# Altium footprint library PCB_Footprints.PcbLib: 303 footprints (part 6 of 19)
Each footprint in its own frame and in the unit in brackets; x right, y up, seen from the top. Pads: shape width x height; smd on the part's side, far side on the other; paste and mask are expansions set on the pad; w line width, h text height; cw(c..) or ccw(c..) is an arc to the next point about the centre after c.
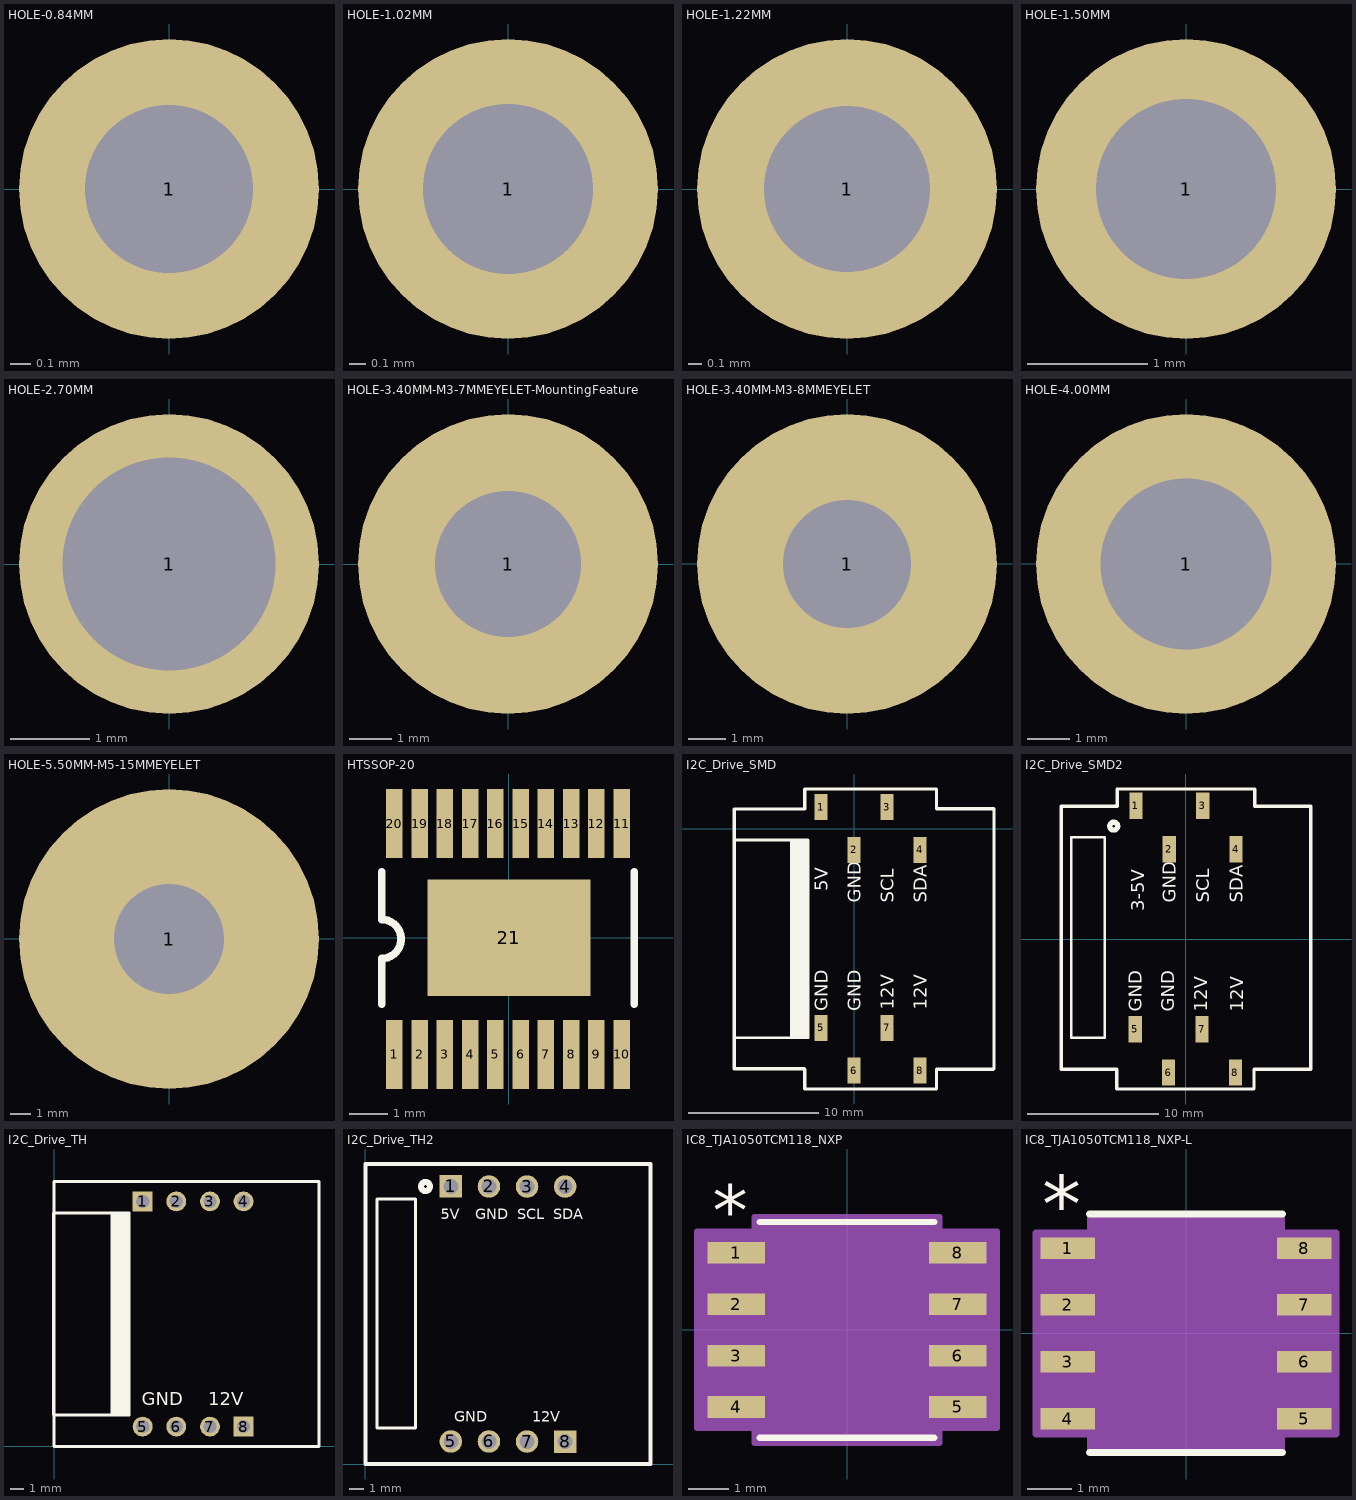
[diagram p5: the footprints below, top view; thin cyan lines are the x and y axes]

## HOLE-0.84MM [mm] "Hole 0.84mm"
pads (1):
  round 1.5 hole 0.84: 1(0,0)

## HOLE-1.02MM [mm] "Hole 1.02mm"
pads (1):
  round 1.8 hole 1.02: 1(0,0)

## HOLE-1.22MM [mm] "Hole 1.22mm"
pads (1):
  round 2.2 hole 1.22: 1(0,0)

## HOLE-1.50MM [mm] "Hole 1.50mm"
pads (1):
  round 2.5 hole 1.5: 1(0,0)

## HOLE-2.70MM [mm] "Hole 2.70mm"
pads (1):
  round 3.8 hole 2.7: 1(0,0)

## HOLE-3.40MM-M3-7MMEYELET-MountingFeature [mm] "Hole 3.40mm with round pad for eyelet"
pads (1):
  round 7 / inner round 4 / far side round 7 hole 3.4 mask+0.2: 1(0,0)
Top Paste:
  region: -0.851,-3.395 -0.641,-3.448 -0.212,-3.5 0.221,-3.5 0.65,-3.446 0.86,-3.393 0.232,-2.196 -0.222,-2.196
  region: 1.799,-3.002 1.985,-2.891 2.325,-2.625 2.631,-2.319 2.896,-1.977 3.007,-1.791 1.717,-1.389 1.396,-1.71
  region: 3.395,-0.851 3.448,-0.641 3.5,-0.212 3.5,0.221 3.446,0.65 3.393,0.86 2.196,0.232 2.196,-0.222
  region: 3.002,1.799 2.891,1.985 2.625,2.325 2.319,2.631 1.977,2.896 1.791,3.007 1.389,1.717 1.71,1.396
  region: 0.851,3.395 0.641,3.448 0.212,3.5 -0.221,3.5 -0.65,3.446 -0.86,3.393 -0.232,2.196 0.222,2.196
  region: -1.799,3.002 -1.985,2.891 -2.325,2.625 -2.631,2.319 -2.896,1.977 -3.007,1.791 -1.717,1.389 -1.396,1.71
  region: -3.395,0.851 -3.448,0.641 -3.5,0.212 -3.5,-0.221 -3.446,-0.65 -3.393,-0.86 -2.196,-0.232 -2.196,0.222
  region: -3.002,-1.799 -2.891,-1.985 -2.625,-2.325 -2.319,-2.631 -1.977,-2.896 -1.791,-3.007 -1.389,-1.717 -1.71,-1.396
Bottom Paste:
  region: -0.851,-3.395 -0.641,-3.448 -0.212,-3.5 0.221,-3.5 0.65,-3.446 0.86,-3.393 0.232,-2.196 -0.222,-2.196
  region: 1.799,-3.002 1.985,-2.891 2.325,-2.625 2.631,-2.319 2.896,-1.977 3.007,-1.791 1.717,-1.389 1.396,-1.71
  region: 3.395,-0.851 3.448,-0.641 3.5,-0.212 3.5,0.221 3.446,0.65 3.393,0.86 2.196,0.232 2.196,-0.222
  region: 3.002,1.799 2.891,1.985 2.625,2.325 2.319,2.631 1.977,2.896 1.791,3.007 1.389,1.717 1.71,1.396
  region: 0.851,3.395 0.641,3.448 0.212,3.5 -0.221,3.5 -0.65,3.446 -0.86,3.393 -0.232,2.196 0.222,2.196
  region: -1.799,3.002 -1.985,2.891 -2.325,2.625 -2.631,2.319 -2.896,1.977 -3.007,1.791 -1.717,1.389 -1.396,1.71
  region: -3.395,0.851 -3.448,0.641 -3.5,0.212 -3.5,-0.221 -3.446,-0.65 -3.393,-0.86 -2.196,-0.232 -2.196,0.222
  region: -3.002,-1.799 -2.891,-1.985 -2.625,-2.325 -2.319,-2.631 -1.977,-2.896 -1.791,-3.007 -1.389,-1.717 -1.71,-1.396
Top Solder:
  region: -0.851,-3.395 -0.641,-3.448 -0.212,-3.5 0.221,-3.5 0.65,-3.446 0.86,-3.393 0.232,-2.196 -0.222,-2.196
  region: 1.799,-3.002 1.985,-2.891 2.325,-2.625 2.631,-2.319 2.896,-1.977 3.007,-1.791 1.717,-1.389 1.396,-1.71
  region: 3.395,-0.851 3.448,-0.641 3.5,-0.212 3.5,0.221 3.446,0.65 3.393,0.86 2.196,0.232 2.196,-0.222
  region: 3.002,1.799 2.891,1.985 2.625,2.325 2.319,2.631 1.977,2.896 1.791,3.007 1.389,1.717 1.71,1.396
  region: 0.851,3.395 0.641,3.448 0.212,3.5 -0.221,3.5 -0.65,3.446 -0.86,3.393 -0.232,2.196 0.222,2.196
  region: -1.799,3.002 -1.985,2.891 -2.325,2.625 -2.631,2.319 -2.896,1.977 -3.007,1.791 -1.717,1.389 -1.396,1.71
  region: -3.395,0.851 -3.448,0.641 -3.5,0.212 -3.5,-0.221 -3.446,-0.65 -3.393,-0.86 -2.196,-0.232 -2.196,0.222
  region: -3.002,-1.799 -2.891,-1.985 -2.625,-2.325 -2.319,-2.631 -1.977,-2.896 -1.791,-3.007 -1.389,-1.717 -1.71,-1.396
Bottom Solder:
  region: -0.851,-3.395 -0.641,-3.448 -0.212,-3.5 0.221,-3.5 0.65,-3.446 0.86,-3.393 0.232,-2.196 -0.222,-2.196
  region: 1.799,-3.002 1.985,-2.891 2.325,-2.625 2.631,-2.319 2.896,-1.977 3.007,-1.791 1.717,-1.389 1.396,-1.71
  region: 3.395,-0.851 3.448,-0.641 3.5,-0.212 3.5,0.221 3.446,0.65 3.393,0.86 2.196,0.232 2.196,-0.222
  region: 3.002,1.799 2.891,1.985 2.625,2.325 2.319,2.631 1.977,2.896 1.791,3.007 1.389,1.717 1.71,1.396
  region: 0.851,3.395 0.641,3.448 0.212,3.5 -0.221,3.5 -0.65,3.446 -0.86,3.393 -0.232,2.196 0.222,2.196
  region: -1.799,3.002 -1.985,2.891 -2.325,2.625 -2.631,2.319 -2.896,1.977 -3.007,1.791 -1.717,1.389 -1.396,1.71
  region: -3.395,0.851 -3.448,0.641 -3.5,0.212 -3.5,-0.221 -3.446,-0.65 -3.393,-0.86 -2.196,-0.232 -2.196,0.222
  region: -3.002,-1.799 -2.891,-1.985 -2.625,-2.325 -2.319,-2.631 -1.977,-2.896 -1.791,-3.007 -1.389,-1.717 -1.71,-1.396

## HOLE-3.40MM-M3-8MMEYELET [mm] "Hole 3.40mm with round pad for eyelet"
pads (1):
  round 8 hole 3.4: 1(0,0)

## HOLE-4.00MM [mm] "Hole 4.00mm"
pads (1):
  round 7 hole 4: 1(0,0)

## HOLE-5.50MM-M5-15MMEYELET [mm] "Hole 5.50mm with round pad for eyelet"
pads (1):
  round 15 hole 5.5: 1(0,0)

## HTSSOP-20 [mm] "HTSSOP 20 pins, Exposed thermal pad, 0.65mm Pitch. Made from TI PWP0020A"
height 1.1
pads (21):
  rect 0.42x1.78 smd: 1(-2.95,-3) 2(-2.3,-3) 3(-1.65,-3) 4(-1,-3) 5(-0.35,-3) 6(0.3,-3) 7(0.95,-3) 8(1.6,-3) 9(2.25,-3) 10(2.9,-3) 11(2.9,2.94) 12(2.25,2.94) 13(1.6,2.94) 14(0.95,2.94) 15(0.3,2.94) 16(-0.35,2.94) 17(-1,2.94) 18(-1.65,2.94) 19(-2.3,2.94) 20(-2.95,2.94)
  rect 4.2x3 smd: 21(0,0)
Top Overlay:
  lines w0.2: -3.275,-1.7 -3.275,-0.53 ccw(c-3.275,-0.03) -3.275,0.47 -3.275,1.7 ; 3.225,-1.7 3.225,1.7
3D body "User Library-HTSSOP20.STEP": height 0.95, standoff -0.06, extent -3.25,-3.207 3.25,3.207

## I2C_Drive_SMD [mm] "Custom E.R I2C Motor Driver"
pads (8):
  rect 1x2 smd: 1(-2.54,1.651) 2(0,-1.651) 3(2.54,1.651) 4(5.08,-1.651) 5(-2.54,-15.349) 6(0,-18.651) 7(2.54,-15.349) 8(5.08,-18.651)
Top Overlay:
  region: -3.555,-16.12 -3.555,-0.88 -4.952,-0.88 -4.952,-16.12
  lines w0.203: -9.27,-16.12 -3.555,-16.12 -3.555,-0.88 -9.27,-0.88 -9.27,-16.12
  lines w0.254: -3.834,1.5 -9.23,1.5 -9.23,-18.5 -3.852,-18.5 -3.81,-18.542 -3.81,-20.066 6.35,-20.066 6.35,-18.542 10.729,-18.542 10.771,-18.5 10.771,1.5 ; -3.81,1.524 -3.81,3.048 6.35,3.048 6.35,1.524 10.747,1.524
  text "12V" at 3.045,-13.967 h1
  text "GND" at -2.035,-14.094 h1
  text "5V" at -2.035,-4.823 h1
  text "GND" at 0.505,-5.712 h1
  text "SCL" at 3.045,-5.712 h1
  text "SDA" at 5.585,-5.712 h1
  text "GND" at 0.505,-14.094 h1
  text "12V" at 5.585,-13.967 h1
3D body "I2C_motorDriver_step.step": height 23.6, standoff -8.9, extent -9.27,-18.5 10.77,1.5
3D body "Header - SMD - Vertical - 4.stp": height 9.7, standoff 0, extent -3.81,-19.464 6.35,-14.46
3D body "Header - SMD - Vertical - 4.stp": height 9.7, standoff 0, extent -3.81,-2.464 6.35,2.54

## I2C_Drive_SMD2 [mm] "Custom E.R I2C Motor Driver"
pads (8):
  rect 1x2 smd: 1(-3.785,10.151) 2(-1.245,6.849) 3(1.295,10.151) 4(3.835,6.849) 5(-3.835,-6.849) 6(-1.295,-10.151) 7(1.245,-6.849) 8(3.785,-10.151)
Top Overlay:
  circle w0.4: c-5.475,8.6 r0.3
  lines w0.2: -8.697,-7.487 -6.157,-7.487 -6.157,7.753 -6.792,7.753 -8.062,7.753 -8.697,7.753 -8.697,-7.487
  lines w0.254: -5.2,11.425 -5.2,10.1 -9.475,10.1 -9.475,-9.9 -5.25,-9.9 -5.25,-11.4 5.2,-11.4 5.2,-9.9 9.526,-9.9 9.526,10.1 5.25,10.1 5.25,11.425 -5.2,11.425 ; -5.2,11.425 -5.2,11.425
  text "12V" at 1.645,-5.52 h1
  text "GND" at -3.355,-5.52 h1
  text "3-5V" at -3.155,2.105 h1
  text "GND" at -0.74,2.788 h1
  text "SCL" at 1.8,2.788 h1
  text "SDA" at 4.34,2.788 h1
  text "GND" at -0.855,-5.52 h1
  text "12V" at 4.395,-5.52 h1
3D body "Header - SMD - Vertical - 4.stp": height 9.7, standoff 0, extent -5.105,-10.964 5.055,-5.96
3D body "Header - SMD - Vertical - 4.stp": height 9.7, standoff 0, extent -5.055,6.036 5.105,11.04
3D body "I2C_motorDriver.step": height 23.6, standoff -8.9, extent -9.475,-9.9 9.526,10.1

## I2C_Drive_TH [mm] "Custom E.R I2C Motor Driver"
pads (8):
  rect 1.5x1.5 hole 1: 1(6.69,18.5) 8(14.31,1.5)
  round 1.5 hole 1: 2(9.23,18.5) 3(11.77,18.5) 4(14.31,18.5) 5(6.69,1.5) 6(9.23,1.5) 7(11.77,1.5)
Top Overlay:
  region: 5.675,2.38 5.675,17.62 4.278,17.62 4.278,2.38
  lines w0.203: -0.04,2.38 5.675,2.38 5.675,17.62 -0.04,17.62 -0.04,2.38
  lines w0.254: 0,0 0,20 20,20 ; 0.001,0 18.001,0 20.001,0 20.001,20
  text "GND" at 6.63,3.13 h1
  text "12V" at 11.63,3.13 h1
3D body "I2C_motorDriver_step.step": height 23.6, standoff -8.9, extent -0.04,0 20,20

## I2C_Drive_TH2 [mm] "Custom E.R I2C Motor Driver"
pads (8):
  rect 1.5x1.5 hole 1: 1(5.69,18.5) 8(13.31,1.5)
  round 1.5 hole 1: 2(8.23,18.5) 3(10.77,18.5) 4(13.31,18.5) 5(5.69,1.5) 6(8.23,1.5) 7(10.77,1.5)
Top Overlay:
  circle w0.4: c4,18.5 r0.3
  lines w0.2: 0.778,2.413 0.778,17.653 1.413,17.653 2.683,17.653 3.318,17.653 3.318,2.413 0.778,2.413
  lines w0.254: 19,20 0,20 0,0 17.001,0 19.001,0 19.001,20
  text "GND" at 5.93,2.83 h0.7
  text "12V" at 11.13,2.83 h0.7
  text "SDA" at 12.53,16.33 h0.7
  text "SCL" at 10.13,16.33 h0.7
  text "5V" at 5.03,16.33 h0.7
  text "GND" at 7.33,16.33 h0.7
3D body "I2C_motorDriver.step": height 23.6, standoff -8.9, extent 0,0 19.001,20

## IC8_TJA1050TCM118_NXP [mil]
pads (8):
  rect 56x21 smd paste+0 mask+0: 1(-108,75) 2(-108,25) 3(-108,-25) 4(-108,-75) 5(108,-75) 6(108,-25) 7(108,25) 8(108,75)
Top Overlay:
  lines w6: -85,-105 85,-105 ; -85,105 85,105
  text "*" at -130.5,91 h50
Mechanical 13:
  lines w0: -12,100 ccw(c0,100) 12,100
  lines w1: -122,-84.5 -122,-65.5 -80,-65.5 -80,-84.5 -122,-84.5 ; -122,-34.5 -122,-15.5 -80,-15.5 -80,-34.5 -122,-34.5 ; -122,15.5 -122,34.5 -80,34.5 -80,15.5 -122,15.5 ; -122,65.5 -122,84.5 -80,84.5 -80,65.5 -122,65.5 ; -80,-100 80,-100 80,100 -80,100 -80,-100 ; 80,-84.5 80,-65.5 122,-65.5 122,-84.5 80,-84.5 ; 80,-34.5 80,-15.5 122,-15.5 122,-34.5 80,-34.5 ; 80,15.5 80,34.5 122,34.5 122,15.5 80,15.5 ; 80,65.5 80,84.5 122,84.5 122,65.5 80,65.5
  text "*" at -77.5,47 h50
Mechanical 15:
  region: -90,-95.5 -146,-95.5 -146,95.5 -90,95.5 -90,110 90,110 90,95.5 146,95.5 146,-95.5 90,-95.5 90,-110 -90,-110
  lines w6: -146,-95.5 -146,95.5 -90,95.5 -90,110 90,110 90,95.5 146,95.5 146,-95.5 90,-95.5 90,-110 -90,-110 -90,-95.5 -146,-95.5
3D body "IC8_TJA1050TCM118_NXP.step": height 69.09, standoff 0, extent -122.01,-100 122.01,100

## IC8_TJA1050TCM118_NXP-L [mil]
pads (8):
  rect 48x19 smd paste+0 mask+0: 1(-104,75) 2(-104,25) 3(-104,-25) 4(-104,-75) 5(104,-75) 6(104,-25) 7(104,25) 8(104,75)
Top Overlay:
  lines w6: -85,-105 85,-105 ; -85,105 85,105
  text "*" at -126.5,89 h50
Mechanical 13:
  lines w0: -12,100 ccw(c0,100) 12,100
  lines w1: -122,-84.5 -80,-84.5 -80,-65.5 -122,-65.5 -122,-84.5 ; -122,-34.5 -80,-34.5 -80,-15.5 -122,-15.5 -122,-34.5 ; -122,15.5 -80,15.5 -80,34.5 -122,34.5 -122,15.5 ; -122,65.5 -80,65.5 -80,84.5 -122,84.5 -122,65.5 ; -80,-100 -80,100 80,100 80,-100 -80,-100 ; 80,-84.5 122,-84.5 122,-65.5 80,-65.5 80,-84.5 ; 80,-34.5 122,-34.5 122,-15.5 80,-15.5 80,-34.5 ; 80,15.5 122,15.5 122,34.5 80,34.5 80,15.5 ; 80,65.5 122,65.5 122,84.5 80,84.5 80,65.5
  text "*" at -77.5,47 h50
Mechanical 15:
  region: -84,-88.5 -132,-88.5 -132,88.5 -84,88.5 -84,104 84,104 84,88.5 132,88.5 132,-88.5 84,-88.5 84,-104 -84,-104
  lines w6: -132,-88.5 -84,-88.5 -84,-104 84,-104 84,-88.5 132,-88.5 132,88.5 84,88.5 84,104 -84,104 -84,88.5 -132,88.5 -132,-88.5
3D body "IC8_TJA1050TCM118_NXP.step": height 69.09, standoff 0, extent -122.01,-100 122.01,100